# Altium footprint library LTEWlib.PcbLib: 125 footprints (part 5 of 8)
Each footprint in its own frame and in the unit in brackets; x right, y up, seen from the top. Pads: shape width x height; smd on the part's side, far side on the other; paste and mask are expansions set on the pad; w line width, h text height; cw(c..) or ccw(c..) is an arc to the next point about the centre after c.
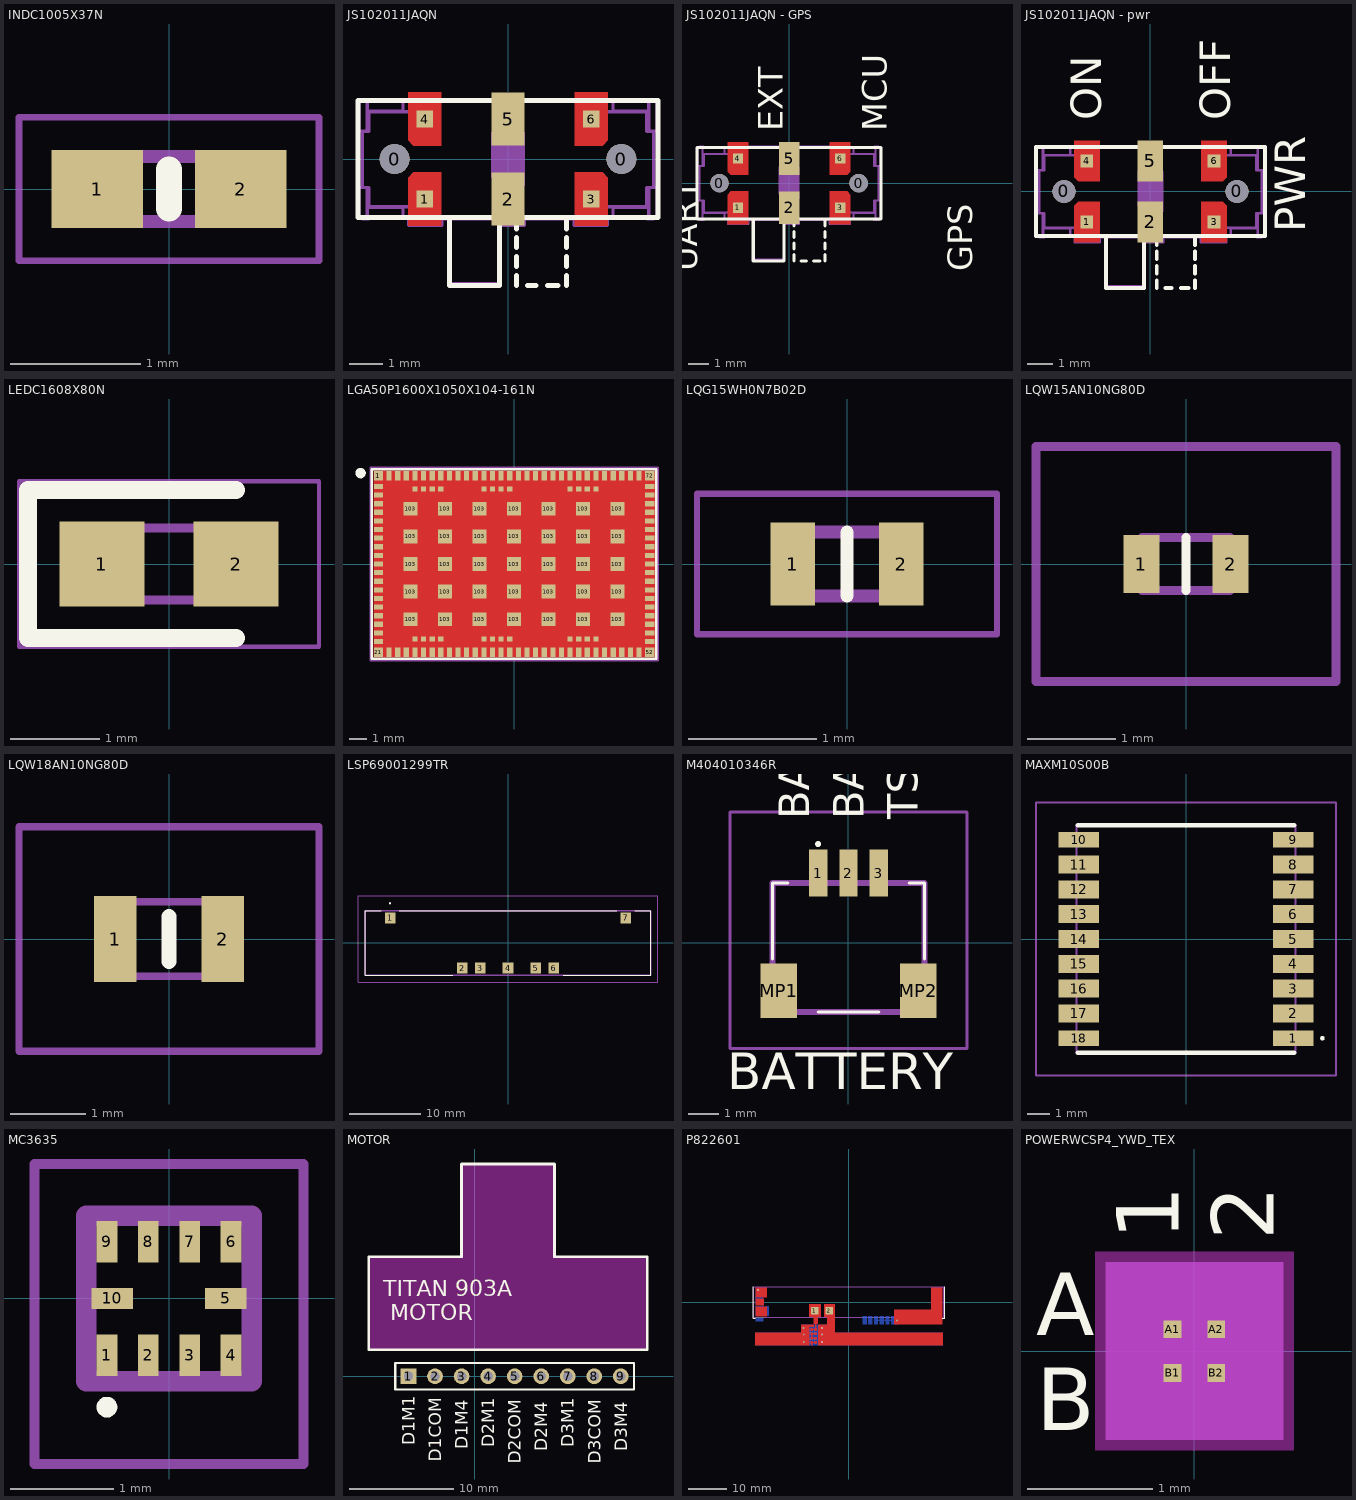
[diagram p4: the footprints below, top view; thin cyan lines are the x and y axes]

## INDC1005X37N [mm]
pads (2):
  rect 0.7x0.6 smd: 1(-0.55,0) 2(0.55,0)
Top Overlay:
  lines w0.2: 0,-0.15 0,0.15
Mechanical 13:
  lines w0.1: -0.5,-0.25 0.5,-0.25 0.5,0.25 -0.5,0.25 -0.5,-0.25
Mechanical 15:
  lines w0.05: -1.15,-0.55 1.15,-0.55 1.15,0.55 -1.15,0.55 -1.15,-0.55
3D body "ATFC-0402-0N2-B-T.stp": height 0.37, standoff 0, extent -0.5,-0.25 0.5,0.25

## JS102011JAQN [mm]
pads (8):
  round 0.9 hole 0.9 unplated mask+0: 0(-3.4,0) 0(3.4,0)
  rect 0.5x0.5 smd: 1(-2.5,-1.2) 3(2.5,-1.2) 4(-2.5,1.2) 6(2.5,1.2)
  rect 1x1.6 smd: 2(0,-1.2) 5(0,1.2)
Top Layer:
  region: -3,0.562 -2.838,0.4 -2,0.4 -2,2 -3,2
  region: -3,-0.562 -2.838,-0.4 -2,-0.4 -2,-2 -3,-2
  region: 3,0.562 2.838,0.4 2,0.4 2,2 3,2
  region: 3,-0.562 2.838,-0.4 2,-0.4 2,-2 3,-2
Top Overlay:
  lines w0.152: -1.75,-1.75 -1.75,-3.8 -0.25,-3.8 -0.25,-1.75 ; 0.25,-3.8 0.25,-3.5 ; 0.25,-3.22 0.25,-2.92 ; 0.25,-2.66 0.25,-2.36 ; 0.25,-2.1 0.25,-1.75 ; 0.59,-3.8 0.84,-3.8 ; 1.19,-3.8 1.44,-3.8 ; 1.2,-3.8 1.5,-3.8 ; 1.75,-3.8 1.75,-3.5 ; 1.75,-3.22 1.75,-2.92 ; 1.75,-2.66 1.75,-2.36 ; 1.75,-2.1 1.75,-1.75 ; -4.5,-1.75 -4.5,1.75 4.5,1.75 4.5,-1.75 -4.5,-1.75
Mechanical 7:
  region: -0.5,-0.554 -0.254,-0.8 0.5,-0.8 0.5,0.8 -0.5,0.8
  lines w0.1: -4.376,-1.747 -4.376,-1.797 -4.174,-1.797 -4.174,-1.747 ; -4.376,1.731 -4.376,1.781 -4.174,1.781 -4.174,1.731 ; -4.224,-1.747 -4.224,-0.853 ; -4.224,-1.449 -3.151,-1.449 -3.151,-1.747 ; -4.224,0.836 -4.224,1.731 ; -4.224,1.433 -3.151,1.433 -3.151,1.731 ; -2.982,-1.747 -2.982,-1.996 -1.988,-1.996 -1.988,-1.797 ; -2.783,-1.747 -2.783,-1.797 -2.772,-1.797 ; -2.783,1.731 -2.783,1.781 -2.772,1.781 ; -2.772,-1.747 -4.472,-1.747 -4.472,-0.853 -4.376,-0.853 ; -2.772,1.731 -4.472,1.731 -4.472,0.836 -4.376,0.836 ; -1.74,-1.797 -1.74,-3.735 -0.249,-3.735 -0.249,-1.797 ; -0.249,-1.996 0.496,-1.996 0.496,-1.797 ; 1.987,-1.797 1.987,-1.996 2.981,-1.996 2.981,-1.747 ; 2.77,-1.747 4.471,-1.747 4.471,-0.853 4.375,-0.853 ; 2.77,1.731 4.471,1.731 4.471,0.836 4.375,0.836 ; 2.782,-1.747 2.782,-1.797 2.77,-1.797 ; 2.782,1.731 2.782,1.781 2.77,1.781 ; 3.149,-1.747 3.149,-1.449 4.223,-1.449 ; 3.149,1.731 3.149,1.433 4.223,1.433 ; 4.173,-1.747 4.173,-1.797 4.375,-1.797 4.375,-1.747 ; 4.173,1.731 4.173,1.781 4.375,1.781 4.375,1.731 ; 4.223,-1.747 4.223,-0.853 ; 4.223,0.836 4.223,1.731 ; -4.376,-0.853 -4.376,0.836 ; -4.376,-0.853 -4.168,-0.853 -4.168,-1.434 -2.772,-1.434 -2.772,-1.797 ; -4.376,0.836 -4.168,0.836 -4.168,1.418 -2.772,1.418 -2.772,1.781 ; -2.772,-1.797 2.77,-1.797 ; -2.772,1.781 2.77,1.781 ; 2.77,-1.797 2.77,-1.434 4.166,-1.434 4.166,-0.853 4.375,-0.853 ; 2.77,1.781 2.77,1.418 4.166,1.418 4.166,0.836 4.375,0.836 ; 4.375,-0.853 4.375,0.836
  text ".Designator" at -0.9,-0.2 h0.38
3D body "CL-SB-22A-11T.stp": height 3.5, standoff 0, extent -4.25,-3.75 4.25,1.75

## JS102011JAQN - GPS [mm]
pads (8):
  round 0.9 hole 0.9 unplated mask+0: 0(-3.4,0) 0(3.4,0)
  rect 0.5x0.5 smd: 1(-2.5,-1.2) 3(2.5,-1.2) 4(-2.5,1.2) 6(2.5,1.2)
  rect 1x1.6 smd: 2(0,-1.2) 5(0,1.2)
Top Layer:
  region: -3,0.562 -2.838,0.4 -2,0.4 -2,2 -3,2
  region: -3,-0.562 -2.838,-0.4 -2,-0.4 -2,-2 -3,-2
  region: 3,0.562 2.838,0.4 2,0.4 2,2 3,2
  region: 3,-0.562 2.838,-0.4 2,-0.4 2,-2 3,-2
Top Overlay:
  lines w0.152: -1.75,-1.75 -1.75,-3.8 -0.25,-3.8 -0.25,-1.75 ; 0.25,-3.8 0.25,-3.5 ; 0.25,-3.22 0.25,-2.92 ; 0.25,-2.66 0.25,-2.36 ; 0.25,-2.1 0.25,-1.75 ; 0.59,-3.8 0.84,-3.8 ; 1.19,-3.8 1.44,-3.8 ; 1.2,-3.8 1.5,-3.8 ; 1.75,-3.8 1.75,-3.5 ; 1.75,-3.22 1.75,-2.92 ; 1.75,-2.66 1.75,-2.36 ; 1.75,-2.1 1.75,-1.75 ; -4.5,-1.75 -4.5,1.75 4.5,1.75 4.5,-1.75 -4.5,-1.75
  text "GPS" at 8.969,-4.317 h1.2
  text "UART" at -4.5,-4.317 h1.2
  text "MCU" at 4.775,2.54 h1.2
  text "EXT" at -0.305,2.54 h1.2
Mechanical 7:
  region: -0.5,-0.554 -0.254,-0.8 0.5,-0.8 0.5,0.8 -0.5,0.8
  lines w0.1: -4.376,-1.747 -4.376,-1.797 -4.174,-1.797 -4.174,-1.747 ; -4.376,1.731 -4.376,1.781 -4.174,1.781 -4.174,1.731 ; -4.224,-1.747 -4.224,-0.853 ; -4.224,-1.449 -3.151,-1.449 -3.151,-1.747 ; -4.224,0.836 -4.224,1.731 ; -4.224,1.433 -3.151,1.433 -3.151,1.731 ; -2.982,-1.747 -2.982,-1.996 -1.988,-1.996 -1.988,-1.797 ; -2.783,-1.747 -2.783,-1.797 -2.772,-1.797 ; -2.783,1.731 -2.783,1.781 -2.772,1.781 ; -2.772,-1.747 -4.472,-1.747 -4.472,-0.853 -4.376,-0.853 ; -2.772,1.731 -4.472,1.731 -4.472,0.836 -4.376,0.836 ; -1.74,-1.797 -1.74,-3.735 -0.249,-3.735 -0.249,-1.797 ; -0.249,-1.996 0.496,-1.996 0.496,-1.797 ; 1.987,-1.797 1.987,-1.996 2.981,-1.996 2.981,-1.747 ; 2.77,-1.747 4.471,-1.747 4.471,-0.853 4.375,-0.853 ; 2.77,1.731 4.471,1.731 4.471,0.836 4.375,0.836 ; 2.782,-1.747 2.782,-1.797 2.77,-1.797 ; 2.782,1.731 2.782,1.781 2.77,1.781 ; 3.149,-1.747 3.149,-1.449 4.223,-1.449 ; 3.149,1.731 3.149,1.433 4.223,1.433 ; 4.173,-1.747 4.173,-1.797 4.375,-1.797 4.375,-1.747 ; 4.173,1.731 4.173,1.781 4.375,1.781 4.375,1.731 ; 4.223,-1.747 4.223,-0.853 ; 4.223,0.836 4.223,1.731 ; -4.376,-0.853 -4.376,0.836 ; -4.376,-0.853 -4.168,-0.853 -4.168,-1.434 -2.772,-1.434 -2.772,-1.797 ; -4.376,0.836 -4.168,0.836 -4.168,1.418 -2.772,1.418 -2.772,1.781 ; -2.772,-1.797 2.77,-1.797 ; -2.772,1.781 2.77,1.781 ; 2.77,-1.797 2.77,-1.434 4.166,-1.434 4.166,-0.853 4.375,-0.853 ; 2.77,1.781 2.77,1.418 4.166,1.418 4.166,0.836 4.375,0.836 ; 4.375,-0.853 4.375,0.836
  text ".Designator" at -0.9,-0.2 h0.38
3D body "CL-SB-22A-11T.stp": height 3.5, standoff 0, extent -4.25,-3.75 4.25,1.75

## JS102011JAQN - pwr [mm]
pads (8):
  round 0.9 hole 0.9 unplated mask+0: 0(-3.4,0) 0(3.4,0)
  rect 0.5x0.5 smd: 1(-2.5,-1.2) 3(2.5,-1.2) 4(-2.5,1.2) 6(2.5,1.2)
  rect 1x1.6 smd: 2(0,-1.2) 5(0,1.2)
Top Layer:
  region: -3,0.562 -2.838,0.4 -2,0.4 -2,2 -3,2
  region: -3,-0.562 -2.838,-0.4 -2,-0.4 -2,-2 -3,-2
  region: 3,0.562 2.838,0.4 2,0.4 2,2 3,2
  region: 3,-0.562 2.838,-0.4 2,-0.4 2,-2 3,-2
Top Overlay:
  lines w0.152: -1.75,-1.75 -1.75,-3.8 -0.25,-3.8 -0.25,-1.75 ; 0.25,-3.8 0.25,-3.5 ; 0.25,-3.22 0.25,-2.92 ; 0.25,-2.66 0.25,-2.36 ; 0.25,-2.1 0.25,-1.75 ; 0.59,-3.8 0.84,-3.8 ; 1.19,-3.8 1.44,-3.8 ; 1.2,-3.8 1.5,-3.8 ; 1.75,-3.8 1.75,-3.5 ; 1.75,-3.22 1.75,-2.92 ; 1.75,-2.66 1.75,-2.36 ; 1.75,-2.1 1.75,-1.75 ; -4.5,-1.75 -4.5,1.75 4.5,1.75 4.5,-1.75 -4.5,-1.75
  text "PWR" at 6.096,-1.599 h1.2
  text "OFF" at 3.14,2.794 h1.2
  text "ON" at -1.94,2.794 h1.2
Mechanical 7:
  region: -0.5,-0.554 -0.254,-0.8 0.5,-0.8 0.5,0.8 -0.5,0.8
  lines w0.1: -4.376,-1.747 -4.376,-1.797 -4.174,-1.797 -4.174,-1.747 ; -4.376,1.731 -4.376,1.781 -4.174,1.781 -4.174,1.731 ; -4.224,-1.747 -4.224,-0.853 ; -4.224,-1.449 -3.151,-1.449 -3.151,-1.747 ; -4.224,0.836 -4.224,1.731 ; -4.224,1.433 -3.151,1.433 -3.151,1.731 ; -2.982,-1.747 -2.982,-1.996 -1.988,-1.996 -1.988,-1.797 ; -2.783,-1.747 -2.783,-1.797 -2.772,-1.797 ; -2.783,1.731 -2.783,1.781 -2.772,1.781 ; -2.772,-1.747 -4.472,-1.747 -4.472,-0.853 -4.376,-0.853 ; -2.772,1.731 -4.472,1.731 -4.472,0.836 -4.376,0.836 ; -1.74,-1.797 -1.74,-3.735 -0.249,-3.735 -0.249,-1.797 ; -0.249,-1.996 0.496,-1.996 0.496,-1.797 ; 1.987,-1.797 1.987,-1.996 2.981,-1.996 2.981,-1.747 ; 2.77,-1.747 4.471,-1.747 4.471,-0.853 4.375,-0.853 ; 2.77,1.731 4.471,1.731 4.471,0.836 4.375,0.836 ; 2.782,-1.747 2.782,-1.797 2.77,-1.797 ; 2.782,1.731 2.782,1.781 2.77,1.781 ; 3.149,-1.747 3.149,-1.449 4.223,-1.449 ; 3.149,1.731 3.149,1.433 4.223,1.433 ; 4.173,-1.747 4.173,-1.797 4.375,-1.797 4.375,-1.747 ; 4.173,1.731 4.173,1.781 4.375,1.781 4.375,1.731 ; 4.223,-1.747 4.223,-0.853 ; 4.223,0.836 4.223,1.731 ; -4.376,-0.853 -4.376,0.836 ; -4.376,-0.853 -4.168,-0.853 -4.168,-1.434 -2.772,-1.434 -2.772,-1.797 ; -4.376,0.836 -4.168,0.836 -4.168,1.418 -2.772,1.418 -2.772,1.781 ; -2.772,-1.797 2.77,-1.797 ; -2.772,1.781 2.77,1.781 ; 2.77,-1.797 2.77,-1.434 4.166,-1.434 4.166,-0.853 4.375,-0.853 ; 2.77,1.781 2.77,1.418 4.166,1.418 4.166,0.836 4.375,0.836 ; 4.375,-0.853 4.375,0.836
  text ".Designator" at -0.9,-0.2 h0.38
3D body "CL-SB-22A-11T.stp": height 3.5, standoff 0, extent -4.25,-3.75 4.25,1.75

## LEDC1608X80N [mm]
pads (2):
  rect 0.95x0.95 smd: 1(-0.75,0) 2(0.75,0)
Top Overlay:
  lines w0.2: 0.75,-0.825 -1.575,-0.825 -1.575,0.825 0.75,0.825
Mechanical 13:
  lines w0.1: -0.8,0.133 -0.533,0.4 ; -0.8,-0.4 -0.8,0.4 0.8,0.4 0.8,-0.4 -0.8,-0.4
Mechanical 15:
  lines w0.05: -1.675,-0.925 -1.675,0.925 1.675,0.925 1.675,-0.925 -1.675,-0.925
3D body "150060VS75000.stp": height 0.7, standoff 0, extent -0.83,-0.4 0.77,0.4

## LGA50P1600X1050X104-161N [mm]
pads (161):
  rect 0.54x0.54 smd mask+0.05: 1(-7.87,5.12) 21(-7.87,-5.12) 52(7.87,-5.12) 72(7.87,5.12)
  rect 0.54x0.3 smd mask+0.05: 2(-7.87,4.5) 3(-7.87,4) 4(-7.87,3.5) 5(-7.87,3) 6(-7.87,2.5) 7(-7.87,2) 8(-7.87,1.5) 9(-7.87,1) 10(-7.87,0.5) 11(-7.87,0) 12(-7.87,-0.5) 13(-7.87,-1) 14(-7.87,-1.5) 15(-7.87,-2) 16(-7.87,-2.5) 17(-7.87,-3) 18(-7.87,-3.5) 19(-7.87,-4) 20(-7.87,-4.5) 53(7.87,-4.5) 54(7.87,-4) 55(7.87,-3.5) 56(7.87,-3) 57(7.87,-2.5) 58(7.87,-2) 59(7.87,-1.5) 60(7.87,-1) 61(7.87,-0.5) 62(7.87,0) 63(7.87,0.5) 64(7.87,1) 65(7.87,1.5) 66(7.87,2) 67(7.87,2.5) 68(7.87,3) 69(7.87,3.5) 70(7.87,4) 71(7.87,4.5)
  rect 0.3x0.54 smd mask+0.05: 22(-7.25,-5.12) 23(-6.75,-5.12) 24(-6.25,-5.12) 25(-5.75,-5.12) 26(-5.25,-5.12) 27(-4.75,-5.12) 28(-4.25,-5.12) 29(-3.75,-5.12) 30(-3.25,-5.12) 31(-2.75,-5.12) 32(-2.25,-5.12) 33(-1.75,-5.12) 34(-1.25,-5.12) 35(-0.75,-5.12) 36(-0.25,-5.12) 37(0.25,-5.12) 38(0.75,-5.12) 39(1.25,-5.12) 40(1.75,-5.12) 41(2.25,-5.12) 42(2.75,-5.12) 43(3.25,-5.12) 44(3.75,-5.12) 45(4.25,-5.12) 46(4.75,-5.12) 47(5.25,-5.12) 48(5.75,-5.12) 49(6.25,-5.12) 50(6.75,-5.12) 51(7.25,-5.12) 73(7.25,5.12) 74(6.75,5.12) 75(6.25,5.12) 76(5.75,5.12) 77(5.25,5.12) 78(4.75,5.12) 79(4.25,5.12) 80(3.75,5.12) 81(3.25,5.12) 82(2.75,5.12) 83(2.25,5.12) 84(1.75,5.12) 85(1.25,5.12) 86(0.75,5.12) 87(0.25,5.12) 88(-0.25,5.12) 89(-0.75,5.12) 90(-1.25,5.12) 91(-1.75,5.12) 92(-2.25,5.12) 93(-2.75,5.12) 94(-3.25,5.12) 95(-3.75,5.12) 96(-4.25,5.12) 97(-4.75,5.12) 98(-5.25,5.12) 99(-5.75,5.12) 100(-6.25,5.12) 101(-6.75,5.12) 102(-7.25,5.12)
  rect 0.8x0.8 smd mask+0.05: 103(-6,-3.2) 103(-6,-1.6) 103(-6,0) 103(-6,1.6) 103(-6,3.2) 103(-4,-3.2) 103(-4,-1.6) 103(-4,0) 103(-4,1.6) 103(-4,3.2) 103(-2,-3.2) 103(-2,-1.6) 103(-2,0) 103(-2,1.6) 103(-2,3.2) 103(0,-3.2) 103(0,-1.6) 103(0,0) 103(0,1.6) 103(0,3.2) 103(2,-3.2) 103(2,-1.6) 103(2,0) 103(2,1.6) 103(2,3.2) 103(4,-3.2) 103(4,-1.6) 103(4,0) 103(4,1.6) 103(4,3.2) 103(6,-3.2) 103(6,-1.6) 103(6,0) 103(6,1.6) 103(6,3.2)
  rect 0.3x0.3 smd mask+0.05: 104(-5.75,-4.35) 105(-5.25,-4.35) 106(-4.75,-4.35) 107(-4.25,-4.35) 108(-1.75,-4.35) 109(-1.25,-4.35) 110(-0.75,-4.35) 111(-0.25,-4.35) 112(3.25,-4.35) 113(3.75,-4.35) 114(4.25,-4.35) 115(4.75,-4.35) 116(4.75,4.35) 117(4.25,4.35) 118(3.75,4.35) 119(3.25,4.35) 120(-0.25,4.35) 121(-0.75,4.35) 122(-1.25,4.35) 123(-1.75,4.35) 124(-4.25,4.35) 125(-4.75,4.35) 126(-5.25,4.35) 127(-5.75,4.35)
Top Layer:
  pour cut-out: -8.15,5.4 8.15,5.4 8.15,-5.4 -8.15,-5.4
Top Overlay:
  circle w0.3: c-8.904,5.274 r0.15
  lines w0.15: -8.25,-5.5 8.25,-5.5 8.25,5.5 -8.25,5.5 -8.25,-5.5
Mechanical 7:
  circle w0.3: c-6.5,3.75 r0.15
  lines w0.1: -8.05,-5.3 8.05,-5.3 8.05,5.3 -8.05,5.3 -8.05,-5.3
  text ".Designator" at 0.5,-0.1 h0.38
Mechanical 15:
  circle w0.3: c-6.5,3.75 r0.15
  lines w0.1: -8.35,-5.6 -8.35,5.6 8.35,5.6 8.35,-5.6 -8.35,-5.6
3D body "nRF9160_v5.step": height 1.2, standoff 0, extent -8.05,-5.3 8.05,5.3

## LQG15WH0N7B02D [mm]
pads (2):
  rect 0.35x0.65 smd: 1(-0.425,0) 2(0.425,0)
Top Overlay:
  lines w0.1: 0,-0.25 0,0.25
Mechanical 13:
  lines w0.1: -0.5,-0.25 -0.5,0.25 0.5,0.25 0.5,-0.25 -0.5,-0.25
Mechanical 15:
  lines w0.05: -1.175,-0.55 -1.175,0.55 1.175,0.55 1.175,-0.55 -1.175,-0.55
3D body "LQG15HS27NJ02D.stp": height 0.55, standoff 0, extent -0.5,-0.25 0.5,0.25

## LQW15AN10NG80D [mm]
pads (2):
  rect 0.41x0.66 smd: 1(-0.505,0) 2(0.505,0)
Top Overlay:
  lines w0.1: 0,-0.3 0,0.3
Mechanical 13:
  lines w0.1: -0.5,-0.3 -0.5,0.3 0.5,0.3 0.5,-0.3 -0.5,-0.3
Mechanical 15:
  lines w0.1: -1.7,-1.33 -1.7,1.33 1.7,1.33 1.7,-1.33 -1.7,-1.33
3D body "LQW15AN22NG80D.stp": height 0.6, standoff 0, extent -0.5,-0.25 0.5,0.25

## LQW18AN10NG80D [mm]
pads (2):
  rect 0.57x1.15 smd: 1(-0.715,0) 2(0.715,0)
Top Overlay:
  lines w0.2: 0,-0.3 0,0.3
Mechanical 13:
  lines w0.1: -0.825,-0.495 0.825,-0.495 0.825,0.495 -0.825,0.495 -0.825,-0.495
Mechanical 15:
  lines w0.1: -2,-1.495 2,-1.495 2,1.495 -2,1.495 -2,-1.495
3D body "LQW18AN11NG8ZD.stp": height 0.9, standoff 0, extent -0.825,-0.495 0.825,0.495

## LSP69001299TR [mm]
pads (7):
  rect 1.5x1.5 smd: 1(-16.5,3.5) 2(-6.4,-3.51) 3(-3.9,-3.51) 4(0,-3.51) 5(3.9,-3.51) 6(6.4,-3.51) 7(16.5,3.5)
Top Overlay:
  lines w0.1: -17.75,4.5 -20,4.5 -20,-4.5 -7.75,-4.5 ; -15.25,4.5 15.25,4.5 ; 7.75,-4.5 20,-4.5 20,4.5 17.75,4.5
  lines w0.2: -16.5,5.5 cw(c-16.5,5.55) -16.5,5.6 ; -16.5,5.5 ccw(c-16.5,5.55) -16.5,5.6 ; -16.5,5.5 cw(c-16.5,5.55) -16.5,5.6
Mechanical 13:
  lines w0.2: -20,-4.5 -20,4.5 20,4.5 20,-4.5 -20,-4.5
Mechanical 15:
  lines w0.1: -21,-5.5 -21,6.6 21,6.6 21,-5.5 -21,-5.5
3D body "LSP69001299TR.stp": height 3.4, standoff 0, extent -20,-4.5 20,4.5

## M404010346R [mm]
pads (5):
  rect 0.6x1.55 smd: 1(-1,2.288) 2(0,2.288) 3(1,2.288)
  rect 1.2x1.8 smd: MP1(-2.3,-1.587) MP2(2.3,-1.587)
Top Overlay:
  lines w0.1: -2.5,-0.537 -2.5,1.963 -2,1.963 ; -1,-2.287 1,-2.287 ; 2,1.963 2.5,1.963 2.5,-0.537 ; -1,3.2 ccw(c-1,3.25) -1,3.3 ccw(c-1,3.25) -1,3.2
  text "BATTERY" at -3.999,-4.826 h1.2
  text "BAT+" at -1.286,4.064 h1
  text "BAT-" at 0.5,4.064 h1
  text "TS" at 2.286,4.064 h1
Mechanical 13:
  lines w0.2: -2.5,-2.287 -2.5,1.963 2.5,1.963 2.5,-2.287 -2.5,-2.287
Mechanical 15:
  lines w0.1: -3.9,-3.487 -3.9,4.3 3.9,4.3 3.9,-3.487 -3.9,-3.487
3D body "M40-4010346R.stp": height 3.35, standoff 0, extent -2.78,-2.367 2.78,3.003

## MAXM10S00B [mm]
pads (18):
  rect 1.8x0.7 smd: 1(4.75,-4.4) 9(4.75,4.4) 10(-4.75,4.4) 18(-4.75,-4.4)
  rect 1.8x0.8 smd: 2(4.75,-3.3) 3(4.75,-2.2) 4(4.75,-1.1) 5(4.75,0) 6(4.75,1.1) 7(4.75,2.2) 8(4.75,3.3) 11(-4.75,3.3) 12(-4.75,2.2) 13(-4.75,1.1) 14(-4.75,0) 15(-4.75,-1.1) 16(-4.75,-2.2) 17(-4.75,-3.3)
Top Overlay:
  lines w0.1: 6,-4.4 ccw(c6.05,-4.4) 6.1,-4.4 ccw(c6.05,-4.4) 6,-4.4
  lines w0.2: -4.8,-5.05 4.8,-5.05 ; -4.8,5.05 4.8,5.05
Mechanical 13:
  lines w0.1: -4.85,-5.05 4.85,-5.05 4.85,5.05 -4.85,5.05 -4.85,-5.05
Mechanical 15:
  lines w0.1: -6.65,-6.05 6.65,-6.05 6.65,6.05 -6.65,6.05 -6.65,-6.05
3D body "MAX-M10S-00B.stp": height 2.8, standoff 0, extent -4.85,-5.05 4.85,5.05

## MC3635 [mm]
pads (10):
  rect 0.2x0.4 smd: 1(-0.6,-0.55) 2(-0.2,-0.55) 3(0.2,-0.55) 4(0.6,-0.55) 6(0.6,0.55) 7(0.2,0.55) 8(-0.2,0.55) 9(-0.6,0.55)
  rect 0.4x0.2 smd: 5(0.55,0) 10(-0.55,0)
Top Overlay:
  lines w0.1: -0.65,-1.05 ccw(c-0.6,-1.05) -0.55,-1.05 ccw(c-0.6,-1.05) -0.65,-1.05
Mechanical 13:
  lines w0.2: -0.8,-0.8 -0.8,0.8 0.8,0.8 0.8,-0.8 -0.8,-0.8
Mechanical 15:
  lines w0.1: -1.3,-1.6 -1.3,1.3 1.3,1.3 1.3,-1.6 -1.3,-1.6
3D body "MC3635.stp": height 1.04, standoff 0, extent -0.8,-0.8 0.8,0.8

## MOTOR [mm] "Titan 903A : 3 Hands Bidirectional, independent motor"
pads (9):
  rect 1.5x1.5 hole 0.9: 1(-6.35,0)
  round 1.5 hole 0.9: 2(-3.81,0) 3(-1.27,0) 4(1.27,0) 5(3.81,0) 6(6.35,0) 7(8.89,0) 8(11.43,0) 9(13.97,0)
Top Overlay:
  lines w0.2: -7.62,-1.27 -7.62,1.27 15.24,1.27 15.24,-1.27 -7.62,-1.27
  lines w0.254: -10.16,2.54 -10.16,11.43 -1.27,11.43 -1.27,20.32 7.62,20.32 7.62,11.43 16.51,11.43 16.51,2.54 -10.16,2.54
  text "TITAN 903A /  MOTOR" at -8.759,5.385 h1.52
  text "D1M1" at -5.75,-6.593 h1.2
  text "D1COM" at -3.21,-8.192 h1.2
  text "D1M4" at -0.67,-6.993 h1.2
  text "D2M1" at 1.87,-6.793 h1.2
  text "D2COM" at 4.41,-8.392 h1.2
  text "D2M4" at 6.95,-7.193 h1.2
  text "D3M1" at 9.49,-6.793 h1.2
  text "D3COM" at 12.03,-8.392 h1.2
  text "D3M4" at 14.57,-7.193 h1.2
Keep-Out Layer:
  rectangle: -1.27,11.43 7.62,20.32
  rectangle: -10.16,2.54 16.51,11.43
3D body: height 2.6, standoff 0.2, extent -10.16,2.54 16.51,20.32
3D body: height 3, standoff 0, extent 4.85,11.43 7.85,19.05
3D body: height 3, standoff 0, extent -1.5,11.43 1.5,19.05
3D body: height 3, standoff 0, extent 7.62,2.31 15.24,5.31
3D body: height 3, standoff 0, extent 7.62,8.66 15.24,11.66
3D body: height 3, standoff 0, extent -8.89,2.31 -1.27,5.31
3D body: height 3, standoff 0, extent -8.89,8.66 -1.27,11.66

## P822601 [mm]
pads (2):
  rect 2x2 smd: 1(-8.89,-2.286) 2(-5.08,-2.286)
via -7.05,-10.466 diameter 0.5 hole 0.25
via -11.84,-10.466 diameter 0.5 hole 0.25
via -7.05,-8.55 diameter 0.5 hole 0.25
via -11.84,-8.55 diameter 0.5 hole 0.25
via 12.7,-4.796 diameter 0.5 hole 0.25
via -23.85,3.254 diameter 0.5 hole 0.25
via -7.05,-6.746 diameter 0.5 hole 0.25
via -11.886,-6.746 diameter 0.5 hole 0.25
Top Layer:
  region: -10.45,-11.296 -24.65,-11.296 -24.65,-7.996 -10.45,-7.996
  region: 24.75,-11.296 -8.05,-11.296 -8.05,-8.001 24.75,-8.001
  region: -8.45,-10.496 -8.95,-10.496 -8.95,-10.296 -8.45,-10.296
  region: -9.45,-10.496 -9.95,-10.496 -9.95,-10.296 -9.45,-10.296
  region: -8.45,-10.696 -9.95,-10.696 -9.95,-10.496 -8.45,-10.496
  region: -8.45,-10.896 -8.95,-10.896 -8.95,-10.696 -8.45,-10.696
  region: -9.45,-10.896 -9.95,-10.896 -9.95,-10.696 -9.45,-10.696
  region: -9.6,-11.296 -9.8,-11.296 -9.8,-10.896 -9.6,-10.896
  region: -7.3,-3.796 -10.4,-3.796 -10.4,-0.596 -7.3,-0.596
  region: -8.2,-5.696 -9.2,-5.696 -9.2,-3.796 -8.2,-3.796
  region: -8.6,-6.896 -8.8,-6.896 -8.8,-5.696 -8.6,-5.696
  region: -8.45,-7.096 -8.95,-7.096 -8.95,-6.896 -8.45,-6.896
  region: -9.45,-7.096 -9.95,-7.096 -9.95,-6.896 -9.45,-6.896
  region: -8.45,-7.296 -9.95,-7.296 -9.95,-7.096 -8.45,-7.096
  region: -8.45,-7.496 -8.95,-7.496 -8.95,-7.296 -8.45,-7.296
  region: -9.45,-7.496 -9.95,-7.496 -9.95,-7.296 -9.45,-7.296
  region: -9.2,-6.496 -12.45,-6.496 -12.45,-5.996 -9.2,-5.996
  region: -10.45,-7.996 -12.45,-7.996 -12.45,-6.496 -10.45,-6.496
  region: -3.67,-3.826 -6.399,-3.826 -6.4,-0.566 -3.67,-0.566
  region: -3.67,-5.996 -5.71,-5.996 -5.71,-3.826 -3.67,-3.826
  region: -3.67,-7.991 -8.05,-7.991 -8.05,-5.996 -3.67,-5.996
  region: 24.6,-2.046 21.7,-2.046 21.7,3.754 24.6,3.754
  region: 24.6,-5.796 12.05,-5.796 12.05,-2.046 24.6,-2.046
  region: -21.6,-3.746 -24.5,-3.746 -24.5,-1.246 -21.6,-1.246
  region: -22.4,-0.846 -24.5,-0.846 -24.5,0.854 -22.4,0.854
  region: -21.6,1.254 -24.5,1.254 -24.5,3.754 -21.6,3.754
  region: -9.45,-9.796 -9.95,-9.796 -9.95,-9.596 -9.45,-9.596
  region: -8.45,-9.796 -8.95,-9.796 -8.95,-9.596 -8.45,-9.596
  region: -8.45,-9.596 -9.95,-9.596 -9.95,-9.396 -8.45,-9.396
  region: -9.45,-9.396 -9.95,-9.396 -9.95,-9.196 -9.45,-9.196
  region: -8.45,-9.396 -8.95,-9.396 -8.95,-9.196 -8.45,-9.196
  region: -9.6,-9.196 -9.8,-9.196 -9.8,-8.596 -9.6,-8.596
  region: -9.45,-8.596 -9.95,-8.596 -9.95,-8.396 -9.45,-8.396
  region: -8.45,-8.596 -8.95,-8.596 -8.95,-8.396 -8.45,-8.396
  region: -8.45,-8.396 -9.95,-8.396 -9.95,-8.196 -8.45,-8.196
  region: -9.45,-8.196 -9.95,-8.196 -9.95,-7.996 -9.45,-7.996
  region: -8.45,-8.196 -8.95,-8.196 -8.95,-7.996 -8.45,-7.996
Bottom Layer:
  region: 24.752,-11.296 -24.648,-11.296 -24.65,-7.996 24.75,-7.996
  region: -3.86,-7.996 -12.45,-7.996 -12.45,-5.996 -3.86,-5.996
  region: 4.7,-5.796 3.7,-5.796 3.7,-3.746 4.7,-3.746
  region: 6.2,-5.796 5.2,-5.796 5.2,-3.746 6.2,-3.746
  region: 13.2,-4.596 11.2,-4.596 11.2,-3.746 13.2,-3.746
  region: 10.7,-4.596 9.7,-4.596 9.7,-3.746 10.7,-3.746
  region: 9.2,-4.596 8.2,-4.596 8.2,-3.746 9.2,-3.746
  region: 7.7,-4.596 6.7,-4.596 6.7,-3.746 7.7,-3.746
  region: 13.2,-4.896 6.7,-4.896 6.7,-4.596 13.2,-4.596
  region: 13.2,-5.796 11.2,-5.796 11.2,-4.896 13.2,-4.896
  region: 10.7,-5.796 9.7,-5.796 9.7,-4.896 10.7,-4.896
  region: 9.2,-5.796 8.2,-5.796 8.2,-4.896 9.2,-4.896
  region: 7.7,-5.796 6.7,-5.796 6.7,-4.896 7.7,-4.896
  region: -22.5,-5.046 -24.5,-5.046 -24.5,-4.046 -22.5,-4.046
  region: -21,-3.546 -22,-3.546 -22,-1.046 -21,-1.046
  region: -22.5,-0.546 -24.5,-0.546 -24.5,3.754 -22.5,3.754
  region: -22.5,-1.046 -22.8,-1.046 -22.8,-0.546 -22.5,-0.546
  region: -22.5,-2.046 -24.5,-2.046 -24.5,-1.046 -22.5,-1.046
  region: -24.196,-2.546 -24.5,-2.546 -24.5,-2.046 -24.196,-2.046
  region: -22.5,-3.546 -24.5,-3.546 -24.5,-2.546 -22.5,-2.546
Top Overlay:
  lines w0.2: -25.2,4.05 -25.2,-4.25 -24.575,-4.25 ; 24.675,-4.25 25.3,-4.25 25.3,4.05
Top Paste:
  region: -21.6,-3.746 -24.5,-3.746 -24.5,-1.246 -21.6,-1.246
  region: -22.4,-0.846 -24.5,-0.846 -24.5,0.854 -22.4,0.854
  region: -21.6,2.654 -23.25,2.654 -23.25,3.737 -21.6,3.737
  region: -21.6,1.254 -24.5,1.254 -24.5,2.654 -21.6,2.654
  region: 16.75,-3.746 14.35,-3.746 14.35,-2.546 16.75,-2.546
  region: 23.5,2.554 21.7,2.554 21.7,3.754 23.5,3.754
  region: 24.6,0.554 21.7,0.554 21.7,2.554 24.6,2.554
  region: 23.5,-0.546 21.7,-0.546 21.7,0.554 23.5,0.554
  region: 24.6,-2.546 21.7,-2.546 21.7,-0.546 24.6,-0.546
  region: 23.5,-3.746 21.7,-3.746 21.7,-2.546 23.5,-2.546
Top Solder:
  region: -21.6,1.254 -24.5,1.254 -24.5,2.654 -21.6,2.654
  region: -21.6,2.654 -23.25,2.654 -23.25,3.737 -21.6,3.737
  region: -22.4,-0.846 -24.5,-0.846 -24.5,0.854 -22.4,0.854
  region: -21.6,-3.746 -24.5,-3.746 -24.5,-1.246 -21.6,-1.246
  region: 23.5,-3.746 21.7,-3.746 21.7,-2.546 23.5,-2.546
  region: 24.6,-2.546 21.7,-2.546 21.7,-0.546 24.6,-0.546
  region: 23.5,-0.546 21.7,-0.546 21.7,0.554 23.5,0.554
  region: 24.6,0.554 21.7,0.554 21.7,2.554 24.6,2.554
  region: 23.5,2.554 21.7,2.554 21.7,3.754 23.5,3.754
  region: 16.75,-3.746 14.35,-3.746 14.35,-2.546 16.75,-2.546
  region: -7.3,-3.746 -10.4,-3.746 -10.4,-0.596 -7.3,-0.596
  region: -3.67,-3.746 -6.4,-3.746 -6.4,-0.546 -3.67,-0.546
Bottom Solder:
  region: 11.8,-5.796 11.2,-5.796 11.2,-5.271 11.8,-5.271
  region: 7.7,-5.796 7.1,-5.796 7.1,-5.271 7.7,-5.271
  region: 8.8,-5.796 8.2,-5.796 8.2,-5.271 8.8,-5.271
  region: 10.7,-5.796 10.1,-5.796 10.1,-5.271 10.7,-5.271
  region: 10.3,-4.271 9.7,-4.271 9.7,-3.746 10.3,-3.746
  region: 9.2,-4.271 8.6,-4.271 8.6,-3.746 9.2,-3.746
  region: 7.3,-4.266 6.7,-4.266 6.7,-3.746 7.3,-3.746
  region: 6.2,-4.266 5.6,-4.266 5.6,-3.746 6.2,-3.746
  region: 4.7,-5.796 4.1,-5.796 4.1,-5.276 4.7,-5.276
  region: 5.8,-5.796 5.2,-5.796 5.2,-5.276 5.8,-5.276
  region: -23.975,-0.546 -24.5,-0.546 -24.5,0.054 -23.975,0.054
  region: -23.975,-4.646 -24.5,-4.646 -24.5,-4.046 -23.975,-4.046
  region: -23.975,-3.546 -24.5,-3.546 -24.5,-2.957 -23.975,-2.957
  region: -23.975,-1.646 -24.5,-1.646 -24.5,-1.046 -23.975,-1.046
  region: -22.5,-3.146 -23.025,-3.146 -23.025,-2.546 -22.5,-2.546
  region: -21.48,-3.146 -22,-3.146 -22,-2.546 -21.48,-2.546
  region: -21.48,-2.046 -22,-2.046 -22,-1.446 -21.48,-1.446
  region: -22.5,-2.046 -23.025,-2.046 -23.025,-1.446 -22.5,-1.446
Mechanical 5:
  region: -8.45,-8.596 -8.95,-8.596 -8.95,-7.996 -8.45,-7.996
  region: -9.45,-8.596 -9.95,-8.596 -9.95,-7.996 -9.45,-7.996
  region: -10.45,-8.596 -10.97,-8.596 -10.97,-7.996 -10.45,-7.996
  region: -9.45,-7.496 -9.95,-7.496 -9.95,-6.896 -9.45,-6.896
  region: -8.45,-7.496 -8.95,-7.496 -8.95,-6.896 -8.45,-6.896
  region: -9.45,-9.785 -9.95,-9.785 -9.95,-9.196 -9.45,-9.196
  region: -8.45,-9.796 -8.95,-9.796 -8.95,-9.196 -8.45,-9.196
  region: -8.45,-10.896 -8.95,-10.896 -8.95,-10.296 -8.45,-10.296
  region: -9.45,-10.896 -9.95,-10.896 -9.95,-10.296 -9.45,-10.296
  region: -10.45,-7.496 -10.97,-7.496 -10.97,-6.896 -10.45,-6.896
  region: -10.45,-9.796 -10.97,-9.796 -10.97,-9.196 -10.45,-9.196
  region: -10.45,-10.896 -10.97,-10.896 -10.97,-10.296 -10.45,-10.296
Mechanical 7:
  lines w0.1: -24.95,-4.005 25.05,-4.005 25.05,4.004 -24.95,4.004 -24.95,-4.005
Mechanical 15:
  lines w0.254: -24.95,-4.005 -24.95,4.004 25.05,4.004 25.05,-4.005 -24.95,-4.005
Multi-Layer:
  pour cut-out: -39.95,5.08 39.05,5.08 39.05,-7.996 -39.95,-7.996
3D body: height 3.2, standoff 0, extent -24.95,-4 25.05,4

## POWERWCSP4_YWD_TEX [mm]
pads (4):
  rect 0.142x0.142 smd paste+0 mask+0: A1(-0.175,0.175) A2(0.175,0.175) B1(-0.175,-0.175) B2(0.175,-0.175)
Top Overlay:
  text "B" at -1.27,-0.635 h0.5
  text "2" at 0.635,0.889 h0.5
  text "1" at -0.127,0.889 h0.5
  text "A" at -1.27,0.127 h0.5
Bottom Overlay:
  text "2" at 0.127,0.889 h0.5
  text "1" at -0.635,0.889 h0.5
  text "B" at -1.016,-0.635 h0.5
  text "A" at -0.889,0.127 h0.5
Keep-Out Layer:
  region: -0.794,-0.795 -0.794,0.795 0.794,0.795 0.794,-0.795
Mechanical 5:
  region: 0.711,-0.711 -0.711,-0.711 -0.711,0.711 0.711,0.711
Mechanical 13:
  lines w0.025: -0.33,0.155 -0.155,0.33 ; -0.33,-0.33 -0.33,0.33 0.33,0.33 0.33,-0.33 -0.33,-0.33
  text "2" at 0.635,0.889 h0.5
  text "1" at -0.127,0.889 h0.5
  text "B" at -1.27,-0.635 h0.5
  text "A" at -1.27,0.127 h0.5
Mechanical 15:
  region: 0.584,-0.584 -0.584,-0.584 -0.584,0.584 0.584,0.584
  lines w0.152: -0.584,-0.584 0.584,-0.584 0.584,0.584 -0.584,0.584 -0.584,-0.584
3D body "POWERWCSP4_YWD_TEX.step": height 0.31, standoff 0, extent -0.33,-0.33 0.33,0.33